# Altium footprint library XU-GENARAL PCB .PcbLib: 1176 footprints (part 12 of 75)
Each footprint in its own frame and in the unit in brackets; x right, y up, seen from the top. Pads: shape width x height; smd on the part's side, far side on the other; paste and mask are expansions set on the pad; w line width, h text height; cw(c..) or ccw(c..) is an arc to the next point about the centre after c.
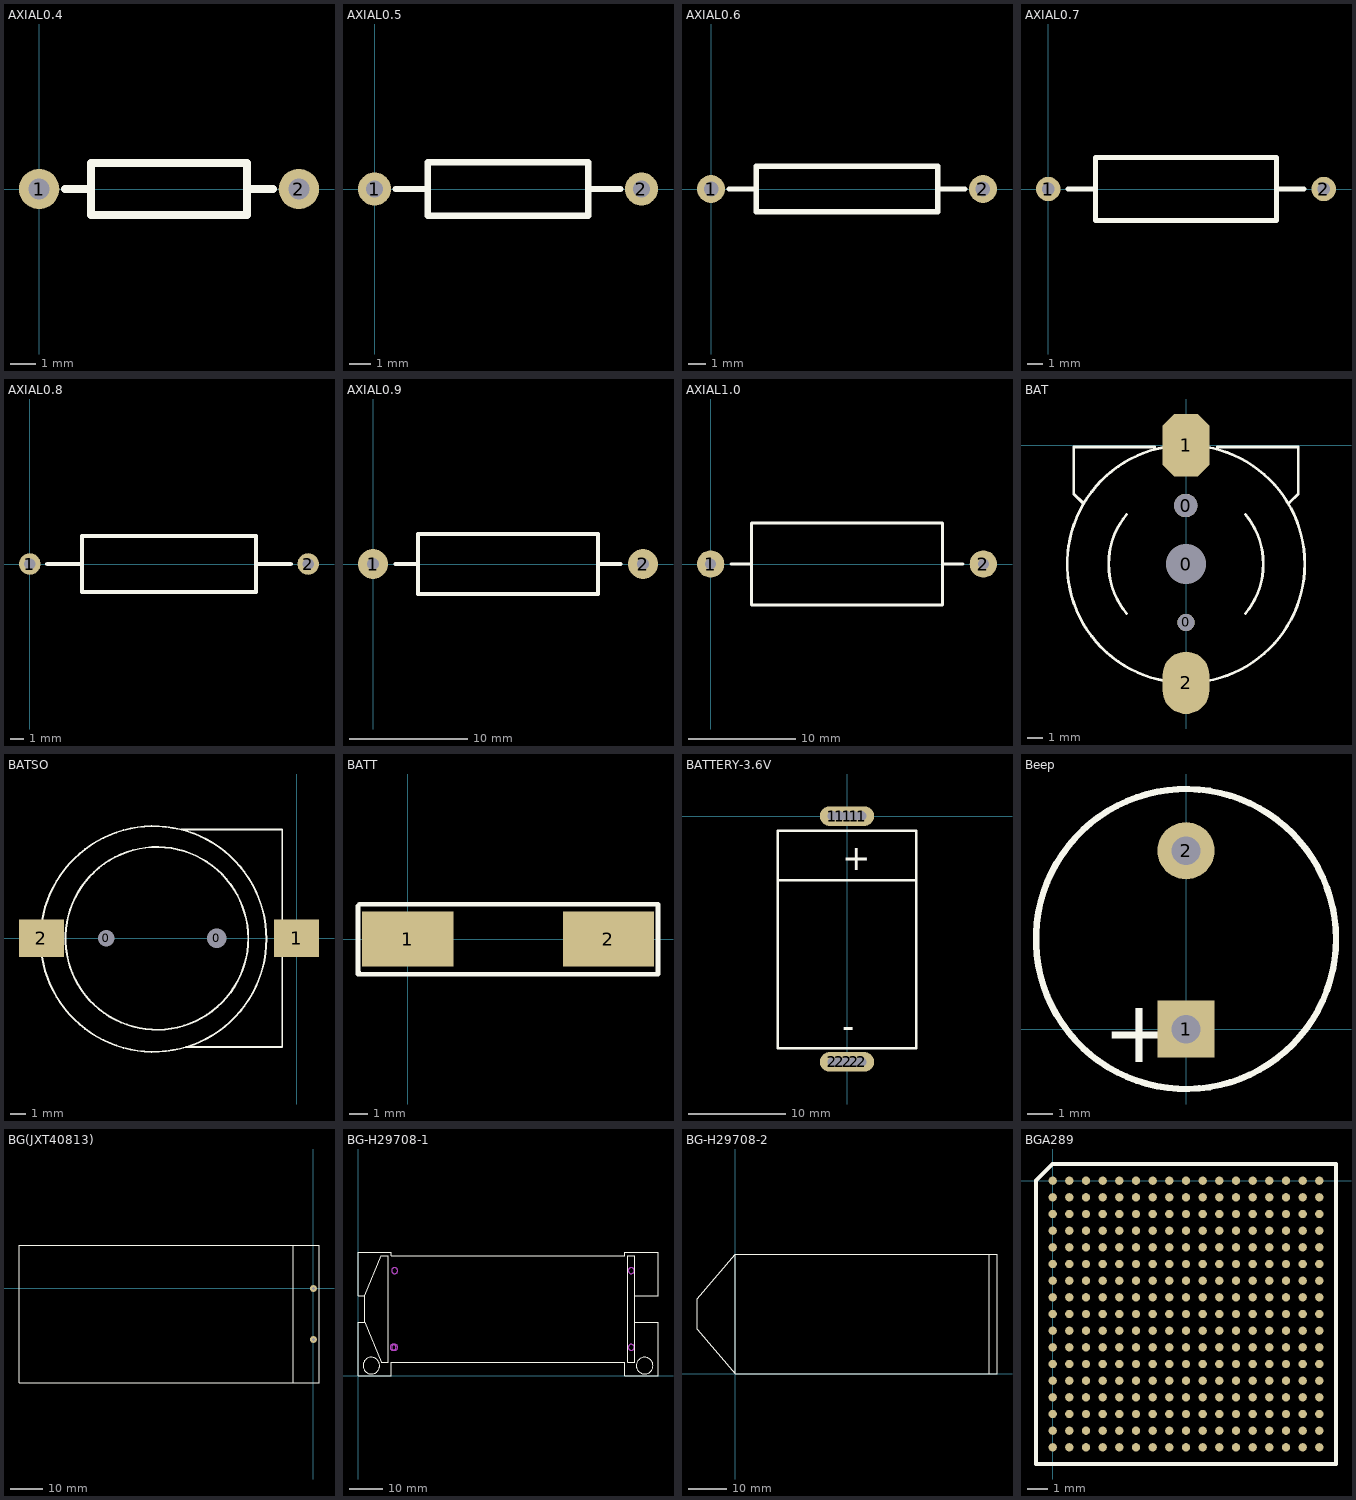
[diagram p11: the footprints below, top view; thin cyan lines are the x and y axes]

## AXIAL0.4 [mil]
pads (2):
  round 62 hole 32: 1(0,0) 2(400,0)
Top Overlay:
  lines w12: 40,0 80,0 ; 320,0 360,0 ; 80,-40 320,-40 320,40 80,40 80,-40

## AXIAL0.5 [mil]
pads (2):
  round 62 hole 32: 1(0,0) 2(500,0)
Top Overlay:
  lines w12: 40,0 100,0 ; 400,0 460,0 ; 100,-50 100,50 400,50 400,-50 100,-50

## AXIAL0.6 [mil]
pads (2):
  round 62 hole 32: 1(0,0) 2(600,0)
Top Overlay:
  lines w12: 40,0 100,0 ; 500,0 560,0 ; 100,-50 100,50 500,50 500,-50 100,-50

## AXIAL0.7 [mil]
pads (2):
  round 62 hole 32: 1(0,0) 2(700,0)
Top Overlay:
  lines w12: 50,0 120,0 ; 580,0 650,0 ; 120,-80 120,80 580,80 580,-80 120,-80

## AXIAL0.8 [mil]
pads (2):
  round 62 hole 32: 1(0,0) 2(800,0)
Top Overlay:
  lines w12: 50,0 150,0 ; 650,0 750,0 ; 150,-80 150,80 650,80 650,-80 150,-80

## AXIAL0.9 [mil]
pads (2):
  round 100 hole 40: 1(0,0) 2(900,0)
Top Overlay:
  lines w12: 75,0 150,0 ; 750,0 825,0 ; 150,-100 150,100 750,100 750,-100 150,-100

## AXIAL1.0 [mil]
pads (2):
  round 100 hole 40: 1(0,0) 2(1000,0)
Top Overlay:
  lines w12: 75,0 150,0 ; 850,0 925,0 ; 150,-150 850,-150 850,150 150,150 150,-150

## BAT [mm]
pads (5):
  round 1.5 hole 1.5: 0(-0.025,-3.87)
  round 1.1 hole 1.1: 0(0,-11.37)
  round 2.54 hole 2.54: 0(0,-7.62)
  oct 3x4 smd: 1(0,0)
  oval 3x4 smd: 2(0,-15.24)
Top Overlay:
  lines w0.178: -6.625,-3.695 -7.2,-3.12 -7.2,-0.12 -2,-0.12 ; -3.812,-10.792 cw(c0,-7.62) -3.81,-4.445 ; -0.833,-15.194 cw(c0,-7.62) -0.833,-0.046 ; 0.833,-15.194 ccw(c0,-7.62) 7.62,-7.62 ccw(c0,-7.62) 0.833,-0.046 ; 2,-0.12 7.2,-0.12 7.2,-3.12 6.6,-3.72 ; 3.812,-10.792 ccw(c0,-7.62) 3.815,-4.451

## BATSO [mm]
pads (4):
  round 1 hole 1.1: 0(-12.7,0)
  round 1 hole 1.3: 0(-5.3,0)
  rect 3x2.5 smd: 1(0,0) 2(-17,0)
Top Overlay:
  circle w0.127: c-9.534,-0.041 r7.526
  circle w0.127: c-9.308,0 r6.092
  lines w0.127: -7.661,7.25 -0.949,7.25 -0.949,-7.25 -2.63,-7.25 -7.382,-7.25

## BATT [mm]
pads (2):
  rect 5x3 smd: 1(0,0) 2(11,0)
Top Overlay:
  lines w0.254: -2.718,1.829 -2.718,-1.93 ; -2.642,-1.854 -2.718,-1.93 ; -2.642,1.905 13.716,1.905 13.716,-1.93 -2.718,-1.93

## BATTERY-3.6V [mil]
pads (10):
  round 80 hole 40: 1(-59.05,0) 1(-29.53,0) 1(29.53,0) 1(59.05,0) 2(-59.05,-996.06) 2(-29.53,-996.06) 2(29.53,-996.06) 2(59.05,-996.06)
  oval 220x80 hole 40: 1(0,0) 2(0,-996.06)
Top Overlay:
  lines w10: -280,-260 280,-260 ; -280,-60 -280,-940 -0.47,-940 ; -279.53,-60 0,-60 279.53,-60 ; 0,-940 279.53,-940 ; 280,-940 280,-60
  text "+" at -20,-220 h100
  text "-" at -20,-900 h100

## Beep [mil]
pads (2):
  rect 90x90 hole 45: 1(0,0)
  round 90 hole 45: 2(0,281)
Top Overlay:
  circle w10: c0,142 r236.22
  text "+" at -131,-52 h100

## BG(JXT40813) [mil]
pads (2):
  round 85 hole 35: A(0,0) K(0,-629.92)
Top Overlay:
  lines w10: -246.06,-1161.42 -246.06,531.5 ; -3631.89,-1161.42 -3631.89,531.5 68.9,531.5 68.9,-1161.42 -3631.89,-1161.42

## BG-H29708-1 [mil]
Top Overlay:
  circle w10: c157.48,118.11 r98.42
  circle w10: c3385.83,118.11 r98.42
  lines w10: 78.74,629.92 275.59,157.48 354.33,157.48 354.33,1417.32 275.59,1417.32 78.74,944.88 ; 78.74,629.92 0,629.92 0,0 393.7,0 393.7,157.48 3149.61,157.48 3149.61,0 3543.31,0 3543.31,629.92 3267.72,629.92 3267.72,944.88 3543.31,944.88 3543.31,1456.69 3149.61,1456.69 3149.61,1417.32 393.7,1417.32 393.7,1456.69 0,1456.69 0,944.88 78.74,944.88 ; 78.74,629.92 78.74,944.88 ; 3188.98,157.48 3188.98,1417.32 3267.72,1417.32 3267.72,157.48 3188.98,157.48
Keep-Out Layer:
  circle w10: c433.07,1240.16 r35.43
  circle w10: c3228.35,334.65 r35.43
  circle w10: c3228.35,1240.16 r35.43
  circle w10: c413.39,334.65 r35.43
  circle w10: c433.07,334.65 r35.43
Mechanical 1:
  circle w10: c433.07,1240.16 r35.43
  circle w10: c433.07,334.65 r35.43
  circle w10: c413.39,334.65 r35.43
  circle w10: c3228.35,1240.16 r35.43
  circle w10: c3228.35,334.65 r35.43

## BG-H29708-2 [mil]
Top Overlay:
  lines w10: 0,1220 -393.7,767.72 -393.7,452.76 0,0 ; 2598.43,0 2598.43,1220.47 ; 0,0 0,1220.47 2677.16,1220.47 2677.16,0 0,0

## BGA289 [mm]
pads (289):
  round 0.4 smd: A1(0,0) A2(0.8,0) A3(1.6,0) A4(2.4,0) A5(3.2,0) A6(4,0) A7(4.8,0) A8(5.6,0) A9(6.4,0) A10(7.2,0) A11(8,0) A12(8.8,0) A13(9.6,0) A14(10.4,0) A15(11.2,0) A16(12,0) A17(12.8,0) B1(0,-0.8) B2(0.8,-0.8) B3(1.6,-0.8) B4(2.4,-0.8) B5(3.2,-0.8) B6(4,-0.8) B7(4.8,-0.8) B8(5.6,-0.8) B9(6.4,-0.8) B10(7.2,-0.8) B11(8,-0.8) B12(8.8,-0.8) B13(9.6,-0.8) B14(10.4,-0.8) B15(11.2,-0.8) B16(12,-0.8) B17(12.8,-0.8) C1(0,-1.6) C2(0.8,-1.6) C3(1.6,-1.6) C4(2.4,-1.6) C5(3.2,-1.6) C6(4,-1.6) C7(4.8,-1.6) C8(5.6,-1.6) C9(6.4,-1.6) C10(7.2,-1.6) C11(8,-1.6) C12(8.8,-1.6) C13(9.6,-1.6) C14(10.4,-1.6) C15(11.2,-1.6) C16(12,-1.6) C17(12.8,-1.6) D1(0,-2.4) D2(0.8,-2.4) D3(1.6,-2.4) D4(2.4,-2.4) D5(3.2,-2.4) D6(4,-2.4) D7(4.8,-2.4) D8(5.6,-2.4) D9(6.4,-2.4) D10(7.2,-2.4) D11(8,-2.4) D12(8.8,-2.4) D13(9.6,-2.4) D14(10.4,-2.4) D15(11.2,-2.4) D16(12,-2.4) D17(12.8,-2.4) E1(0,-3.2) E2(0.8,-3.2) E3(1.6,-3.2) E4(2.4,-3.2) E5(3.2,-3.2) E6(4,-3.2) E7(4.8,-3.2) E8(5.6,-3.2) E9(6.4,-3.2) E10(7.2,-3.2) E11(8,-3.2) E12(8.8,-3.2) E13(9.6,-3.2) E14(10.4,-3.2) E15(11.2,-3.2) E16(12,-3.2) E17(12.8,-3.2) F1(0,-4) F2(0.8,-4) F3(1.6,-4) F4(2.4,-4) F5(3.2,-4) F6(4,-4) F7(4.8,-4) F8(5.6,-4) F9(6.4,-4) F10(7.2,-4) F11(8,-4) F12(8.8,-4) F13(9.6,-4) F14(10.4,-4) F15(11.2,-4) F16(12,-4) F17(12.8,-4) G1(0,-4.8) G2(0.8,-4.8) G3(1.6,-4.8) G4(2.4,-4.8) G5(3.2,-4.8) G6(4,-4.8) G7(4.8,-4.8) G8(5.6,-4.8) G9(6.4,-4.8) G10(7.2,-4.8) G11(8,-4.8) G12(8.8,-4.8) G13(9.6,-4.8) G14(10.4,-4.8) G15(11.2,-4.8) G16(12,-4.8) G17(12.8,-4.8) H1(0,-5.6) H2(0.8,-5.6) H3(1.6,-5.6) H4(2.4,-5.6) H5(3.2,-5.6) H6(4,-5.6) H7(4.8,-5.6) H8(5.6,-5.6) H9(6.4,-5.6) H10(7.2,-5.6) H11(8,-5.6) H12(8.8,-5.6) H13(9.6,-5.6) H14(10.4,-5.6) H15(11.2,-5.6) H16(12,-5.6) H17(12.8,-5.6) J1(0,-6.4) J2(0.8,-6.4) J3(1.6,-6.4) J4(2.4,-6.4) J5(3.2,-6.4) J6(4,-6.4) J7(4.8,-6.4) J8(5.6,-6.4) J9(6.4,-6.4) J10(7.2,-6.4) J11(8,-6.4) J12(8.8,-6.4) J13(9.6,-6.4) J14(10.4,-6.4) J15(11.2,-6.4) J16(12,-6.4) J17(12.8,-6.4) K1(0,-7.2) K2(0.8,-7.2) K3(1.6,-7.2) K4(2.4,-7.2) K5(3.2,-7.2) K6(4,-7.2) K7(4.8,-7.2) K8(5.6,-7.2) K9(6.4,-7.2) K10(7.2,-7.2) K11(8,-7.2) K12(8.8,-7.2) K13(9.6,-7.2) K14(10.4,-7.2) K15(11.2,-7.2) K16(12,-7.2) K17(12.8,-7.2) L1(0,-8) L2(0.8,-8) L3(1.6,-8) L4(2.4,-8) L5(3.2,-8) L6(4,-8) L7(4.8,-8) L8(5.6,-8) L9(6.4,-8) L10(7.2,-8) L11(8,-8) L12(8.8,-8) L13(9.6,-8) L14(10.4,-8) L15(11.2,-8) L16(12,-8) L17(12.8,-8) M1(0,-8.8) M2(0.8,-8.8) M3(1.6,-8.8) M4(2.4,-8.8) M5(3.2,-8.8) M6(4,-8.8) M7(4.8,-8.8) M8(5.6,-8.8) M9(6.4,-8.8) M10(7.2,-8.8) M11(8,-8.8) M12(8.8,-8.8) M13(9.6,-8.8) M14(10.4,-8.8) M15(11.2,-8.8) M16(12,-8.8) M17(12.8,-8.8) N1(0,-9.6) N2(0.8,-9.6) N3(1.6,-9.6) N4(2.4,-9.6) N5(3.2,-9.6) N6(4,-9.6) N7(4.8,-9.6) N8(5.6,-9.6) N9(6.4,-9.6) N10(7.2,-9.6) N11(8,-9.6) N12(8.8,-9.6) N13(9.6,-9.6) N14(10.4,-9.6) N15(11.2,-9.6) N16(12,-9.6) N17(12.8,-9.6) P1(0,-10.4) P2(0.8,-10.4) P3(1.6,-10.4) P4(2.4,-10.4) P5(3.2,-10.4) P6(4,-10.4) P7(4.8,-10.4) P8(5.6,-10.4) P9(6.4,-10.4) P10(7.2,-10.4) P11(8,-10.4) P12(8.8,-10.4) P13(9.6,-10.4) P14(10.4,-10.4) P15(11.2,-10.4) P16(12,-10.4) P17(12.8,-10.4) R1(0,-11.2) R2(0.8,-11.2) R3(1.6,-11.2) R4(2.4,-11.2) R5(3.2,-11.2) R6(4,-11.2) R7(4.8,-11.2) R8(5.6,-11.2) R9(6.4,-11.2) R10(7.2,-11.2) R11(8,-11.2) R12(8.8,-11.2) R13(9.6,-11.2) R14(10.4,-11.2) R15(11.2,-11.2) R16(12,-11.2) R17(12.8,-11.2) T1(0,-12) T2(0.8,-12) T3(1.6,-12) T4(2.4,-12) T5(3.2,-12) T6(4,-12) T7(4.8,-12) T8(5.6,-12) T9(6.4,-12) T10(7.2,-12) T11(8,-12) T12(8.8,-12) T13(9.6,-12) T14(10.4,-12) T15(11.2,-12) T16(12,-12) T17(12.8,-12) U1(0,-12.8) U2(0.8,-12.8) U3(1.6,-12.8) U4(2.4,-12.8) U5(3.2,-12.8) U6(4,-12.8) U7(4.8,-12.8) U8(5.6,-12.8) U9(6.4,-12.8) U10(7.2,-12.8) U11(8,-12.8) U12(8.8,-12.8) U13(9.6,-12.8) U14(10.4,-12.8) U15(11.2,-12.8) U16(12,-12.8) U17(12.8,-12.8)
Top Overlay:
  lines w0.2: -0.8,-13.6 -0.8,0 0,0.8 13.6,0.8 13.6,-13.6 -0.8,-13.6